# Altium schematic symbol library jlcpcb_2025_04_capacitors_extended_0402.schlib: 3594 symbols (part 6 of 20) (continued)
## C1005NP0470JGT
designator C?  Capacitance: 47pF  (hidden comment: *)
Capacitor, Ceramic (MLCC), 47pF, ±5%, 50V, NP0, ±5%, SMD 0402; Manufacturer: Darfon Elec; Manufacturer Part Number: C1005NP0470JGT; Package Size: 0402; JLCPCB Basic Part: No; JLCPCB Part Number: C258505; Supplier 1: LCSC; Category: Capacitors - MLCC; Supplier Part Number 1: C258505; Tolerance: ±5%; Voltage Rating: 50V; Temperature Coefficient: NP0; RoHS: Yes; ComponentLink1Description: Datasheet; ComponentLink1URL: https://wmsc.lcsc.com/wmsc/upload/file/pdf/v2/lcsc/2304140030_Darfon-Elec-C1005NP0470JGT_C258505.pdf; ComponentLink2Description: JLCPCB Part URL; ComponentLink2URL: https://jlcpcb.com/partdetail/C258505; ComponentLink3Description: LCSC Part URL; ComponentLink3URL: https://lcsc.com/product-detail/Multilayer-Ceramic-Capacitors-MLCC---SMD-SMT_Darfon-Elec-Darfon-Elec-C1005NP0470JGT_C258505.html
footprint CAP-0402 (0402 (1005M) Capacitor)
pins: 1, 2

## C1005NP0470KGTS
designator C?  Capacitance: 47pF  (hidden comment: *)
Capacitor, Ceramic (MLCC), 47pF, ±10%, 50V, NP0, ±10%, SMD 0402; Manufacturer: Darfon Elec; Manufacturer Part Number: C1005NP0470KGTS; Package Size: 0402; JLCPCB Basic Part: No; JLCPCB Part Number: C267398; Supplier 1: LCSC; Category: Capacitors - MLCC; Supplier Part Number 1: C267398; Tolerance: ±10%; Voltage Rating: 50V; Temperature Coefficient: NP0; RoHS: Yes; ComponentLink1Description: Datasheet; ComponentLink1URL: https://wmsc.lcsc.com/wmsc/upload/file/pdf/v2/lcsc/2304140030_Darfon-Elec-C1005NP0470KGTS_C267398.pdf; ComponentLink2Description: JLCPCB Part URL; ComponentLink2URL: https://jlcpcb.com/partdetail/C267398; ComponentLink3Description: LCSC Part URL; ComponentLink3URL: https://lcsc.com/product-detail/Multilayer-Ceramic-Capacitors-MLCC---SMD-SMT_Darfon-Elec-Darfon-Elec-C1005NP0470KGTS_C267398.html
footprint CAP-0402 (0402 (1005M) Capacitor)
pins: 1, 2

## C1005NP0471JGTS
designator C?  Capacitance: 470pF  (hidden comment: *)
Capacitor, Ceramic (MLCC), 470pF, ±5%, 50V, NP0, ±5%, SMD 0402; Manufacturer: Darfon Elec; Manufacturer Part Number: C1005NP0471JGTS; Package Size: 0402; JLCPCB Basic Part: No; JLCPCB Part Number: C147490; Supplier 1: LCSC; Category: Capacitors - MLCC; Supplier Part Number 1: C147490; Tolerance: ±5%; Voltage Rating: 50V; Temperature Coefficient: NP0; RoHS: Yes; ComponentLink1Description: Datasheet; ComponentLink1URL: https://wmsc.lcsc.com/wmsc/upload/file/pdf/v2/lcsc/2304140030_Darfon-Elec-C1005NP0471JGTS_C147490.pdf; ComponentLink2Description: JLCPCB Part URL; ComponentLink2URL: https://jlcpcb.com/partdetail/C147490; ComponentLink3Description: LCSC Part URL; ComponentLink3URL: https://lcsc.com/product-detail/Multilayer-Ceramic-Capacitors-MLCC---SMD-SMT_Darfon-Elec-Darfon-Elec-C1005NP0471JGTS_C147490.html
footprint CAP-0402 (0402 (1005M) Capacitor)
pins: 1, 2

## C1005NP0479CGT
designator C?  Capacitance: 4.7pF  (hidden comment: *)
Capacitor, Ceramic (MLCC), 4.7pF, 50V, NP0, SMD 0402; Manufacturer: Darfon Elec; Manufacturer Part Number: C1005NP0479CGT; Package Size: 0402; JLCPCB Basic Part: No; JLCPCB Part Number: C258495; Supplier 1: LCSC; Category: Capacitors - MLCC; Supplier Part Number 1: C258495; Voltage Rating: 50V; Temperature Coefficient: NP0; RoHS: Yes; ComponentLink1Description: Datasheet; ComponentLink1URL: https://wmsc.lcsc.com/wmsc/upload/file/pdf/v2/lcsc/2304140030_Darfon-Elec-C1005NP0479CGT_C258495.pdf; ComponentLink2Description: JLCPCB Part URL; ComponentLink2URL: https://jlcpcb.com/partdetail/C258495; ComponentLink3Description: LCSC Part URL; ComponentLink3URL: https://lcsc.com/product-detail/Multilayer-Ceramic-Capacitors-MLCC---SMD-SMT_Darfon-Elec-Darfon-Elec-C1005NP0479CGT_C258495.html
footprint CAP-0402 (0402 (1005M) Capacitor)
pins: 1, 2

## C1005NP0479CGTS
designator C?  Capacitance: 4.7pF  (hidden comment: *)
Capacitor, Ceramic (MLCC), 4.7pF, 50V, NP0, SMD 0402; Manufacturer: Darfon Elec; Manufacturer Part Number: C1005NP0479CGTS; Package Size: 0402; JLCPCB Basic Part: No; JLCPCB Part Number: C147369; Supplier 1: LCSC; Category: Capacitors - MLCC; Supplier Part Number 1: C147369; Voltage Rating: 50V; Temperature Coefficient: NP0; RoHS: Yes; ComponentLink1Description: Datasheet; ComponentLink1URL: https://wmsc.lcsc.com/wmsc/upload/file/pdf/v2/lcsc/2304140030_Darfon-Elec-C1005NP0479CGTS_C147369.pdf; ComponentLink2Description: JLCPCB Part URL; ComponentLink2URL: https://jlcpcb.com/partdetail/C147369; ComponentLink3Description: LCSC Part URL; ComponentLink3URL: https://lcsc.com/product-detail/Multilayer-Ceramic-Capacitors-MLCC---SMD-SMT_Darfon-Elec-Darfon-Elec-C1005NP0479CGTS_C147369.html
footprint CAP-0402 (0402 (1005M) Capacitor)
pins: 1, 2

## C1005NP0508BGTS
designator C?  Capacitance: 0.5pF  (hidden comment: *)
Capacitor, Ceramic (MLCC), 0.5pF, 50V, NP0, SMD 0402; Manufacturer: Darfon Elec; Manufacturer Part Number: C1005NP0508BGTS; Package Size: 0402; JLCPCB Basic Part: No; JLCPCB Part Number: C2987830; Supplier 1: LCSC; Category: Capacitors - MLCC; Supplier Part Number 1: C2987830; Voltage Rating: 50V; Temperature Coefficient: NP0; RoHS: Yes; ComponentLink1Description: Datasheet; ComponentLink1URL: https://wmsc.lcsc.com/wmsc/upload/file/pdf/v2/lcsc/2204011630_Darfon-Elec-C1005NP0508BGTS_C2987830.pdf; ComponentLink2Description: JLCPCB Part URL; ComponentLink2URL: https://jlcpcb.com/partdetail/C2987830; ComponentLink3Description: LCSC Part URL; ComponentLink3URL: https://lcsc.com/product-detail/Multilayer-Ceramic-Capacitors-MLCC---SMD-SMT_Darfon-Elec-Darfon-Elec-C1005NP0508BGTS_C2987830.html
footprint CAP-0402 (0402 (1005M) Capacitor)
pins: 1, 2

## C1005NP0508CGT
designator C?  Capacitance: 0.5pF  (hidden comment: *)
Capacitor, Ceramic (MLCC), 0.5pF, 50V, NP0, SMD 0402; Manufacturer: Darfon Elec; Manufacturer Part Number: C1005NP0508CGT; Package Size: 0402; JLCPCB Basic Part: No; JLCPCB Part Number: C258483; Supplier 1: LCSC; Category: Capacitors - MLCC; Supplier Part Number 1: C258483; Voltage Rating: 50V; Temperature Coefficient: NP0; RoHS: Yes; ComponentLink1Description: Datasheet; ComponentLink1URL: https://wmsc.lcsc.com/wmsc/upload/file/pdf/v2/lcsc/2304140030_Darfon-Elec-C1005NP0508CGT_C258483.pdf; ComponentLink2Description: JLCPCB Part URL; ComponentLink2URL: https://jlcpcb.com/partdetail/C258483; ComponentLink3Description: LCSC Part URL; ComponentLink3URL: https://lcsc.com/product-detail/Multilayer-Ceramic-Capacitors-MLCC---SMD-SMT_Darfon-Elec-Darfon-Elec-C1005NP0508CGT_C258483.html
footprint CAP-0402 (0402 (1005M) Capacitor)
pins: 1, 2

## C1005NP0508CGTS
designator C?  Capacitance: 0.5pF  (hidden comment: *)
Capacitor, Ceramic (MLCC), 0.5pF, 50V, NP0, SMD 0402; Manufacturer: Darfon Elec; Manufacturer Part Number: C1005NP0508CGTS; Package Size: 0402; JLCPCB Basic Part: No; JLCPCB Part Number: C147327; Supplier 1: LCSC; Category: Capacitors - MLCC; Supplier Part Number 1: C147327; Voltage Rating: 50V; Temperature Coefficient: NP0; RoHS: Yes; ComponentLink1Description: Datasheet; ComponentLink1URL: https://wmsc.lcsc.com/wmsc/upload/file/pdf/v2/lcsc/2304140030_Darfon-Elec-C1005NP0508CGTS_C147327.pdf; ComponentLink2Description: JLCPCB Part URL; ComponentLink2URL: https://jlcpcb.com/partdetail/C147327; ComponentLink3Description: LCSC Part URL; ComponentLink3URL: https://lcsc.com/product-detail/Multilayer-Ceramic-Capacitors-MLCC---SMD-SMT_Darfon-Elec-Darfon-Elec-C1005NP0508CGTS_C147327.html
footprint CAP-0402 (0402 (1005M) Capacitor)
pins: 1, 2

## C1005NP0508DGTS
designator C?  Capacitance: 0.5pF  (hidden comment: *)
Capacitor, Ceramic (MLCC), 0.5pF, 50V, NP0, SMD 0402; Manufacturer: Darfon Elec; Manufacturer Part Number: C1005NP0508DGTS; Package Size: 0402; JLCPCB Basic Part: No; JLCPCB Part Number: C311880; Supplier 1: LCSC; Category: Capacitors - MLCC; Supplier Part Number 1: C311880; Voltage Rating: 50V; Temperature Coefficient: NP0; RoHS: Yes; ComponentLink1Description: Datasheet; ComponentLink1URL: https://wmsc.lcsc.com/wmsc/upload/file/pdf/v2/lcsc/2304140030_Darfon-Elec-C1005NP0508DGTS_C311880.pdf; ComponentLink2Description: JLCPCB Part URL; ComponentLink2URL: https://jlcpcb.com/partdetail/C311880; ComponentLink3Description: LCSC Part URL; ComponentLink3URL: https://lcsc.com/product-detail/Multilayer-Ceramic-Capacitors-MLCC---SMD-SMT_Darfon-Elec-Darfon-Elec-C1005NP0508DGTS_C311880.html
footprint CAP-0402 (0402 (1005M) Capacitor)
pins: 1, 2

## C1005NP0509CGTS
designator C?  Capacitance: 5pF  (hidden comment: *)
Capacitor, Ceramic (MLCC), 5pF, 50V, NP0, SMD 0402; Manufacturer: Darfon Elec; Manufacturer Part Number: C1005NP0509CGTS; Package Size: 0402; JLCPCB Basic Part: No; JLCPCB Part Number: C359289; Supplier 1: LCSC; Category: Capacitors - MLCC; Supplier Part Number 1: C359289; Voltage Rating: 50V; Temperature Coefficient: NP0; RoHS: Yes; ComponentLink1Description: Datasheet; ComponentLink1URL: https://wmsc.lcsc.com/wmsc/upload/file/pdf/v2/lcsc/2304140030_Darfon-Elec-C1005NP0509CGTS_C359289.pdf; ComponentLink2Description: JLCPCB Part URL; ComponentLink2URL: https://jlcpcb.com/partdetail/C359289; ComponentLink3Description: LCSC Part URL; ComponentLink3URL: https://lcsc.com/product-detail/Multilayer-Ceramic-Capacitors-MLCC---SMD-SMT_Darfon-Elec-Darfon-Elec-C1005NP0509CGTS_C359289.html
footprint CAP-0402 (0402 (1005M) Capacitor)
pins: 1, 2

## C1005NP0509DGTS
designator C?  Capacitance: 5pF  (hidden comment: *)
Capacitor, Ceramic (MLCC), 5pF, 50V, NP0, SMD 0402; Manufacturer: Darfon Elec; Manufacturer Part Number: C1005NP0509DGTS; Package Size: 0402; JLCPCB Basic Part: No; JLCPCB Part Number: C147372; Supplier 1: LCSC; Category: Capacitors - MLCC; Supplier Part Number 1: C147372; Voltage Rating: 50V; Temperature Coefficient: NP0; RoHS: Yes; ComponentLink1Description: Datasheet; ComponentLink1URL: https://wmsc.lcsc.com/wmsc/upload/file/pdf/v2/lcsc/2304140030_Darfon-Elec-C1005NP0509DGTS_C147372.pdf; ComponentLink2Description: JLCPCB Part URL; ComponentLink2URL: https://jlcpcb.com/partdetail/C147372; ComponentLink3Description: LCSC Part URL; ComponentLink3URL: https://lcsc.com/product-detail/Multilayer-Ceramic-Capacitors-MLCC---SMD-SMT_Darfon-Elec-Darfon-Elec-C1005NP0509DGTS_C147372.html
footprint CAP-0402 (0402 (1005M) Capacitor)
pins: 1, 2

## C1005NP0560JGT
designator C?  Capacitance: 56pF  (hidden comment: *)
Capacitor, Ceramic (MLCC), 56pF, ±5%, 50V, NP0, ±5%, SMD 0402; Manufacturer: Darfon Elec; Manufacturer Part Number: C1005NP0560JGT; Package Size: 0402; JLCPCB Basic Part: No; JLCPCB Part Number: C258506; Supplier 1: LCSC; Category: Capacitors - MLCC; Supplier Part Number 1: C258506; Tolerance: ±5%; Voltage Rating: 50V; Temperature Coefficient: NP0; RoHS: Yes; ComponentLink1Description: Datasheet; ComponentLink1URL: https://wmsc.lcsc.com/wmsc/upload/file/pdf/v2/lcsc/2304140030_Darfon-Elec-C1005NP0560JGT_C258506.pdf; ComponentLink2Description: JLCPCB Part URL; ComponentLink2URL: https://jlcpcb.com/partdetail/C258506; ComponentLink3Description: LCSC Part URL; ComponentLink3URL: https://lcsc.com/product-detail/Multilayer-Ceramic-Capacitors-MLCC---SMD-SMT_Darfon-Elec-Darfon-Elec-C1005NP0560JGT_C258506.html
footprint CAP-0402 (0402 (1005M) Capacitor)
pins: 1, 2

## C1005NP0560JGTS
designator C?  Capacitance: 56pF  (hidden comment: *)
Capacitor, Ceramic (MLCC), 56pF, ±5%, 50V, NP0, ±5%, SMD 0402; Manufacturer: Darfon Elec; Manufacturer Part Number: C1005NP0560JGTS; Package Size: 0402; JLCPCB Basic Part: No; JLCPCB Part Number: C147458; Supplier 1: LCSC; Category: Capacitors - MLCC; Supplier Part Number 1: C147458; Tolerance: ±5%; Voltage Rating: 50V; Temperature Coefficient: NP0; RoHS: Yes; ComponentLink1Description: Datasheet; ComponentLink1URL: https://wmsc.lcsc.com/wmsc/upload/file/pdf/v2/lcsc/2304140030_Darfon-Elec-C1005NP0560JGTS_C147458.pdf; ComponentLink2Description: JLCPCB Part URL; ComponentLink2URL: https://jlcpcb.com/partdetail/C147458; ComponentLink3Description: LCSC Part URL; ComponentLink3URL: https://lcsc.com/product-detail/Multilayer-Ceramic-Capacitors-MLCC---SMD-SMT_Darfon-Elec-Darfon-Elec-C1005NP0560JGTS_C147458.html
footprint CAP-0402 (0402 (1005M) Capacitor)
pins: 1, 2

## C1005NP0560KGTS
designator C?  Capacitance: 56pF  (hidden comment: *)
Capacitor, Ceramic (MLCC), 56pF, ±10%, 50V, NP0, ±10%, SMD 0402; Manufacturer: Darfon Elec; Manufacturer Part Number: C1005NP0560KGTS; Package Size: 0402; JLCPCB Basic Part: No; JLCPCB Part Number: C311876; Supplier 1: LCSC; Category: Capacitors - MLCC; Supplier Part Number 1: C311876; Tolerance: ±10%; Voltage Rating: 50V; Temperature Coefficient: NP0; RoHS: Yes; ComponentLink1Description: Datasheet; ComponentLink1URL: https://wmsc.lcsc.com/wmsc/upload/file/pdf/v2/lcsc/2304140030_Darfon-Elec-C1005NP0560KGTS_C311876.pdf; ComponentLink2Description: JLCPCB Part URL; ComponentLink2URL: https://jlcpcb.com/partdetail/C311876; ComponentLink3Description: LCSC Part URL; ComponentLink3URL: https://lcsc.com/product-detail/Multilayer-Ceramic-Capacitors-MLCC---SMD-SMT_Darfon-Elec-Darfon-Elec-C1005NP0560KGTS_C311876.html
footprint CAP-0402 (0402 (1005M) Capacitor)
pins: 1, 2

## C1005NP0569DGT
designator C?  Capacitance: 5.6pF  (hidden comment: *)
Capacitor, Ceramic (MLCC), 5.6pF, 50V, NP0, SMD 0402; Manufacturer: Darfon Elec; Manufacturer Part Number: C1005NP0569DGT; Package Size: 0402; JLCPCB Basic Part: No; JLCPCB Part Number: C258497; Supplier 1: LCSC; Category: Capacitors - MLCC; Supplier Part Number 1: C258497; Voltage Rating: 50V; Temperature Coefficient: NP0; RoHS: Yes; ComponentLink1Description: Datasheet; ComponentLink1URL: https://wmsc.lcsc.com/wmsc/upload/file/pdf/v2/lcsc/2304140030_Darfon-Elec-C1005NP0569DGT_C258497.pdf; ComponentLink2Description: JLCPCB Part URL; ComponentLink2URL: https://jlcpcb.com/partdetail/C258497; ComponentLink3Description: LCSC Part URL; ComponentLink3URL: https://lcsc.com/product-detail/Multilayer-Ceramic-Capacitors-MLCC---SMD-SMT_Darfon-Elec-Darfon-Elec-C1005NP0569DGT_C258497.html
footprint CAP-0402 (0402 (1005M) Capacitor)
pins: 1, 2

## C1005NP0569DGTS
designator C?  Capacitance: 5.6pF  (hidden comment: *)
Capacitor, Ceramic (MLCC), 5.6pF, 50V, NP0, SMD 0402; Manufacturer: Darfon Elec; Manufacturer Part Number: C1005NP0569DGTS; Package Size: 0402; JLCPCB Basic Part: No; JLCPCB Part Number: C147378; Supplier 1: LCSC; Category: Capacitors - MLCC; Supplier Part Number 1: C147378; Voltage Rating: 50V; Temperature Coefficient: NP0; RoHS: Yes; ComponentLink1Description: Datasheet; ComponentLink1URL: https://wmsc.lcsc.com/wmsc/upload/file/pdf/v2/lcsc/2304140030_Darfon-Elec-C1005NP0569DGTS_C147378.pdf; ComponentLink2Description: JLCPCB Part URL; ComponentLink2URL: https://jlcpcb.com/partdetail/C147378; ComponentLink3Description: LCSC Part URL; ComponentLink3URL: https://lcsc.com/product-detail/Multilayer-Ceramic-Capacitors-MLCC---SMD-SMT_Darfon-Elec-Darfon-Elec-C1005NP0569DGTS_C147378.html
footprint CAP-0402 (0402 (1005M) Capacitor)
pins: 1, 2

## C1005NP0608AGTQ
designator C?  Capacitance: 0.6pF  (hidden comment: *)
Capacitor, Ceramic (MLCC), 0.6pF, 50V, NP0, SMD 0402; Manufacturer: Darfon Elec; Manufacturer Part Number: C1005NP0608AGTQ; Package Size: 0402; JLCPCB Basic Part: No; JLCPCB Part Number: C718625; Supplier 1: LCSC; Category: Capacitors - MLCC; Supplier Part Number 1: C718625; Voltage Rating: 50V; Temperature Coefficient: NP0; RoHS: Yes; ComponentLink1Description: Datasheet; ComponentLink1URL: https://wmsc.lcsc.com/wmsc/upload/file/pdf/v2/lcsc/2304140030_Darfon-Elec-C1005NP0608AGTQ_C718625.pdf; ComponentLink2Description: JLCPCB Part URL; ComponentLink2URL: https://jlcpcb.com/partdetail/C718625; ComponentLink3Description: LCSC Part URL; ComponentLink3URL: https://lcsc.com/product-detail/Multilayer-Ceramic-Capacitors-MLCC---SMD-SMT_Darfon-Elec-Darfon-Elec-C1005NP0608AGTQ_C718625.html
footprint CAP-0402 (0402 (1005M) Capacitor)
pins: 1, 2

## C1005NP0609DGT
designator C?  Capacitance: 6pF  (hidden comment: *)
Capacitor, Ceramic (MLCC), 6pF, 50V, NP0, SMD 0402; Manufacturer: Darfon Elec; Manufacturer Part Number: C1005NP0609DGT; Package Size: 0402; JLCPCB Basic Part: No; JLCPCB Part Number: C258498; Supplier 1: LCSC; Category: Capacitors - MLCC; Supplier Part Number 1: C258498; Voltage Rating: 50V; Temperature Coefficient: NP0; RoHS: Yes; ComponentLink1Description: Datasheet; ComponentLink1URL: https://wmsc.lcsc.com/wmsc/upload/file/pdf/v2/lcsc/2304140030_Darfon-Elec-C1005NP0609DGT_C258498.pdf; ComponentLink2Description: JLCPCB Part URL; ComponentLink2URL: https://jlcpcb.com/partdetail/C258498; ComponentLink3Description: LCSC Part URL; ComponentLink3URL: https://lcsc.com/product-detail/Multilayer-Ceramic-Capacitors-MLCC---SMD-SMT_Darfon-Elec-Darfon-Elec-C1005NP0609DGT_C258498.html
footprint CAP-0402 (0402 (1005M) Capacitor)
pins: 1, 2

## C1005NP0609DGTS
designator C?  Capacitance: 6pF  (hidden comment: *)
Capacitor, Ceramic (MLCC), 6pF, 50V, NP0, SMD 0402; Manufacturer: Darfon Elec; Manufacturer Part Number: C1005NP0609DGTS; Package Size: 0402; JLCPCB Basic Part: No; JLCPCB Part Number: C147381; Supplier 1: LCSC; Category: Capacitors - MLCC; Supplier Part Number 1: C147381; Voltage Rating: 50V; Temperature Coefficient: NP0; RoHS: Yes; ComponentLink1Description: Datasheet; ComponentLink1URL: https://wmsc.lcsc.com/wmsc/upload/file/pdf/v2/lcsc/2304140030_Darfon-Elec-C1005NP0609DGTS_C147381.pdf; ComponentLink2Description: JLCPCB Part URL; ComponentLink2URL: https://jlcpcb.com/partdetail/C147381; ComponentLink3Description: LCSC Part URL; ComponentLink3URL: https://lcsc.com/product-detail/Multilayer-Ceramic-Capacitors-MLCC---SMD-SMT_Darfon-Elec-Darfon-Elec-C1005NP0609DGTS_C147381.html
footprint CAP-0402 (0402 (1005M) Capacitor)
pins: 1, 2

## C1005NP0680JGTS
designator C?  Capacitance: 68pF  (hidden comment: *)
Capacitor, Ceramic (MLCC), 68pF, ±5%, 50V, NP0, ±5%, SMD 0402; Manufacturer: Darfon Elec; Manufacturer Part Number: C1005NP0680JGTS; Package Size: 0402; JLCPCB Basic Part: No; JLCPCB Part Number: C147464; Supplier 1: LCSC; Category: Capacitors - MLCC; Supplier Part Number 1: C147464; Tolerance: ±5%; Voltage Rating: 50V; Temperature Coefficient: NP0; RoHS: Yes; ComponentLink1Description: Datasheet; ComponentLink1URL: https://wmsc.lcsc.com/wmsc/upload/file/pdf/v2/lcsc/2304140030_Darfon-Elec-C1005NP0680JGTS_C147464.pdf; ComponentLink2Description: JLCPCB Part URL; ComponentLink2URL: https://jlcpcb.com/partdetail/C147464; ComponentLink3Description: LCSC Part URL; ComponentLink3URL: https://lcsc.com/product-detail/Multilayer-Ceramic-Capacitors-MLCC---SMD-SMT_Darfon-Elec-Darfon-Elec-C1005NP0680JGTS_C147464.html
footprint CAP-0402 (0402 (1005M) Capacitor)
pins: 1, 2

## C1005NP0680KGTS
designator C?  Capacitance: 68pF  (hidden comment: *)
Capacitor, Ceramic (MLCC), 68pF, ±10%, 50V, NP0, ±10%, SMD 0402; Manufacturer: Darfon Elec; Manufacturer Part Number: C1005NP0680KGTS; Package Size: 0402; JLCPCB Basic Part: No; JLCPCB Part Number: C311866; Supplier 1: LCSC; Category: Capacitors - MLCC; Supplier Part Number 1: C311866; Tolerance: ±10%; Voltage Rating: 50V; Temperature Coefficient: NP0; RoHS: Yes; ComponentLink1Description: Datasheet; ComponentLink1URL: https://wmsc.lcsc.com/wmsc/upload/file/pdf/v2/lcsc/2304140030_Darfon-Elec-C1005NP0680KGTS_C311866.pdf; ComponentLink2Description: JLCPCB Part URL; ComponentLink2URL: https://jlcpcb.com/partdetail/C311866; ComponentLink3Description: LCSC Part URL; ComponentLink3URL: https://lcsc.com/product-detail/Multilayer-Ceramic-Capacitors-MLCC---SMD-SMT_Darfon-Elec-Darfon-Elec-C1005NP0680KGTS_C311866.html
footprint CAP-0402 (0402 (1005M) Capacitor)
pins: 1, 2

## C1005NP0689DGT
designator C?  Capacitance: 6.8pF  (hidden comment: *)
Capacitor, Ceramic (MLCC), 6.8pF, 50V, NP0, SMD 0402; Manufacturer: Darfon Elec; Manufacturer Part Number: C1005NP0689DGT; Package Size: 0402; JLCPCB Basic Part: No; JLCPCB Part Number: C258499; Supplier 1: LCSC; Category: Capacitors - MLCC; Supplier Part Number 1: C258499; Voltage Rating: 50V; Temperature Coefficient: NP0; RoHS: Yes; ComponentLink1Description: Datasheet; ComponentLink1URL: https://wmsc.lcsc.com/wmsc/upload/file/pdf/v2/lcsc/2304140030_Darfon-Elec-C1005NP0689DGT_C258499.pdf; ComponentLink2Description: JLCPCB Part URL; ComponentLink2URL: https://jlcpcb.com/partdetail/C258499; ComponentLink3Description: LCSC Part URL; ComponentLink3URL: https://lcsc.com/product-detail/Multilayer-Ceramic-Capacitors-MLCC---SMD-SMT_Darfon-Elec-Darfon-Elec-C1005NP0689DGT_C258499.html
footprint CAP-0402 (0402 (1005M) Capacitor)
pins: 1, 2

## C1005NP0689DGTS
designator C?  Capacitance: 6.8pF  (hidden comment: *)
Capacitor, Ceramic (MLCC), 6.8pF, 50V, NP0, SMD 0402; Manufacturer: Darfon Elec; Manufacturer Part Number: C1005NP0689DGTS; Package Size: 0402; JLCPCB Basic Part: No; JLCPCB Part Number: C147387; Supplier 1: LCSC; Category: Capacitors - MLCC; Supplier Part Number 1: C147387; Voltage Rating: 50V; Temperature Coefficient: NP0; RoHS: Yes; ComponentLink1Description: Datasheet; ComponentLink1URL: https://wmsc.lcsc.com/wmsc/upload/file/pdf/v2/lcsc/2304140030_Darfon-Elec-C1005NP0689DGTS_C147387.pdf; ComponentLink2Description: JLCPCB Part URL; ComponentLink2URL: https://jlcpcb.com/partdetail/C147387; ComponentLink3Description: LCSC Part URL; ComponentLink3URL: https://lcsc.com/product-detail/Multilayer-Ceramic-Capacitors-MLCC---SMD-SMT_Darfon-Elec-Darfon-Elec-C1005NP0689DGTS_C147387.html
footprint CAP-0402 (0402 (1005M) Capacitor)
pins: 1, 2

## C1005NP0709DGTS
designator C?  Capacitance: 7pF  (hidden comment: *)
Capacitor, Ceramic (MLCC), 7pF, 50V, NP0, SMD 0402; Manufacturer: Darfon Elec; Manufacturer Part Number: C1005NP0709DGTS; Package Size: 0402; JLCPCB Basic Part: No; JLCPCB Part Number: C147390; Supplier 1: LCSC; Category: Capacitors - MLCC; Supplier Part Number 1: C147390; Voltage Rating: 50V; Temperature Coefficient: NP0; RoHS: Yes; ComponentLink1Description: Datasheet; ComponentLink1URL: https://wmsc.lcsc.com/wmsc/upload/file/pdf/v2/lcsc/2304140030_Darfon-Elec-C1005NP0709DGTS_C147390.pdf; ComponentLink2Description: JLCPCB Part URL; ComponentLink2URL: https://jlcpcb.com/partdetail/C147390; ComponentLink3Description: LCSC Part URL; ComponentLink3URL: https://lcsc.com/product-detail/Multilayer-Ceramic-Capacitors-MLCC---SMD-SMT_Darfon-Elec-Darfon-Elec-C1005NP0709DGTS_C147390.html
footprint CAP-0402 (0402 (1005M) Capacitor)
pins: 1, 2

## C1005NP0758CGTS
designator C?  Capacitance: 0.75pF  (hidden comment: *)
Capacitor, Ceramic (MLCC), 0.75pF, 50V, NP0, SMD 0402; Manufacturer: Darfon Elec; Manufacturer Part Number: C1005NP0758CGTS; Package Size: 0402; JLCPCB Basic Part: No; JLCPCB Part Number: C311856; Supplier 1: LCSC; Category: Capacitors - MLCC; Supplier Part Number 1: C311856; Voltage Rating: 50V; Temperature Coefficient: NP0; RoHS: Yes; ComponentLink1Description: Datasheet; ComponentLink1URL: https://wmsc.lcsc.com/wmsc/upload/file/pdf/v2/lcsc/2304140030_Darfon-Elec-C1005NP0758CGTS_C311856.pdf; ComponentLink2Description: JLCPCB Part URL; ComponentLink2URL: https://jlcpcb.com/partdetail/C311856; ComponentLink3Description: LCSC Part URL; ComponentLink3URL: https://lcsc.com/product-detail/Multilayer-Ceramic-Capacitors-MLCC---SMD-SMT_Darfon-Elec-Darfon-Elec-C1005NP0758CGTS_C311856.html
footprint CAP-0402 (0402 (1005M) Capacitor)
pins: 1, 2

## C1005NP0808CGT
designator C?  Capacitance: 0.8pF  (hidden comment: *)
Capacitor, Ceramic (MLCC), 0.8pF, 50V, NP0, SMD 0402; Manufacturer: Darfon Elec; Manufacturer Part Number: C1005NP0808CGT; Package Size: 0402; JLCPCB Basic Part: No; JLCPCB Part Number: C258484; Supplier 1: LCSC; Category: Capacitors - MLCC; Supplier Part Number 1: C258484; Voltage Rating: 50V; Temperature Coefficient: NP0; RoHS: Yes; ComponentLink1Description: Datasheet; ComponentLink1URL: https://wmsc.lcsc.com/wmsc/upload/file/pdf/v2/lcsc/2304140030_Darfon-Elec-C1005NP0808CGT_C258484.pdf; ComponentLink2Description: JLCPCB Part URL; ComponentLink2URL: https://jlcpcb.com/partdetail/C258484; ComponentLink3Description: LCSC Part URL; ComponentLink3URL: https://lcsc.com/product-detail/Multilayer-Ceramic-Capacitors-MLCC---SMD-SMT_Darfon-Elec-Darfon-Elec-C1005NP0808CGT_C258484.html
footprint CAP-0402 (0402 (1005M) Capacitor)
pins: 1, 2

## C1005NP0809DGT
designator C?  Capacitance: 8pF  (hidden comment: *)
Capacitor, Ceramic (MLCC), 8pF, 50V, NP0, SMD 0402; Manufacturer: Darfon Elec; Manufacturer Part Number: C1005NP0809DGT; Package Size: 0402; JLCPCB Basic Part: No; JLCPCB Part Number: C258500; Supplier 1: LCSC; Category: Capacitors - MLCC; Supplier Part Number 1: C258500; Voltage Rating: 50V; Temperature Coefficient: NP0; RoHS: Yes; ComponentLink1Description: Datasheet; ComponentLink1URL: https://wmsc.lcsc.com/wmsc/upload/file/pdf/v2/lcsc/2304140030_Darfon-Elec-C1005NP0809DGT_C258500.pdf; ComponentLink2Description: JLCPCB Part URL; ComponentLink2URL: https://jlcpcb.com/partdetail/C258500; ComponentLink3Description: LCSC Part URL; ComponentLink3URL: https://lcsc.com/product-detail/Multilayer-Ceramic-Capacitors-MLCC---SMD-SMT_Darfon-Elec-Darfon-Elec-C1005NP0809DGT_C258500.html
footprint CAP-0402 (0402 (1005M) Capacitor)
pins: 1, 2

## C1005NP0809DGTS
designator C?  Capacitance: 8pF  (hidden comment: *)
Capacitor, Ceramic (MLCC), 8pF, 50V, NP0, SMD 0402; Manufacturer: Darfon Elec; Manufacturer Part Number: C1005NP0809DGTS; Package Size: 0402; JLCPCB Basic Part: No; JLCPCB Part Number: C147396; Supplier 1: LCSC; Category: Capacitors - MLCC; Supplier Part Number 1: C147396; Voltage Rating: 50V; Temperature Coefficient: NP0; RoHS: Yes; ComponentLink1Description: Datasheet; ComponentLink1URL: https://wmsc.lcsc.com/wmsc/upload/file/pdf/v2/lcsc/2304140030_Darfon-Elec-C1005NP0809DGTS_C147396.pdf; ComponentLink2Description: JLCPCB Part URL; ComponentLink2URL: https://jlcpcb.com/partdetail/C147396; ComponentLink3Description: LCSC Part URL; ComponentLink3URL: https://lcsc.com/product-detail/Multilayer-Ceramic-Capacitors-MLCC---SMD-SMT_Darfon-Elec-Darfon-Elec-C1005NP0809DGTS_C147396.html
footprint CAP-0402 (0402 (1005M) Capacitor)
pins: 1, 2

## C1005NP0820JGTS
designator C?  Capacitance: 82pF  (hidden comment: *)
Capacitor, Ceramic (MLCC), 82pF, ±5%, 50V, NP0, ±5%, SMD 0402; Manufacturer: Darfon Elec; Manufacturer Part Number: C1005NP0820JGTS; Package Size: 0402; JLCPCB Basic Part: No; JLCPCB Part Number: C147470; Supplier 1: LCSC; Category: Capacitors - MLCC; Supplier Part Number 1: C147470; Tolerance: ±5%; Voltage Rating: 50V; Temperature Coefficient: NP0; RoHS: Yes; ComponentLink1Description: Datasheet; ComponentLink1URL: https://wmsc.lcsc.com/wmsc/upload/file/pdf/v2/lcsc/2304140030_Darfon-Elec-C1005NP0820JGTS_C147470.pdf; ComponentLink2Description: JLCPCB Part URL; ComponentLink2URL: https://jlcpcb.com/partdetail/C147470; ComponentLink3Description: LCSC Part URL; ComponentLink3URL: https://lcsc.com/product-detail/Multilayer-Ceramic-Capacitors-MLCC---SMD-SMT_Darfon-Elec-Darfon-Elec-C1005NP0820JGTS_C147470.html
footprint CAP-0402 (0402 (1005M) Capacitor)
pins: 1, 2

## C1005NP0820KGTS
designator C?  Capacitance: 82pF  (hidden comment: *)
Capacitor, Ceramic (MLCC), 82pF, ±10%, 50V, NP0, ±10%, SMD 0402; Manufacturer: Darfon Elec; Manufacturer Part Number: C1005NP0820KGTS; Package Size: 0402; JLCPCB Basic Part: No; JLCPCB Part Number: C311842; Supplier 1: LCSC; Category: Capacitors - MLCC; Supplier Part Number 1: C311842; Tolerance: ±10%; Voltage Rating: 50V; Temperature Coefficient: NP0; RoHS: Yes; ComponentLink1Description: Datasheet; ComponentLink1URL: https://wmsc.lcsc.com/wmsc/upload/file/pdf/v2/lcsc/2304140030_Darfon-Elec-C1005NP0820KGTS_C311842.pdf; ComponentLink2Description: JLCPCB Part URL; ComponentLink2URL: https://jlcpcb.com/partdetail/C311842; ComponentLink3Description: LCSC Part URL; ComponentLink3URL: https://lcsc.com/product-detail/Multilayer-Ceramic-Capacitors-MLCC---SMD-SMT_Darfon-Elec-Darfon-Elec-C1005NP0820KGTS_C311842.html
footprint CAP-0402 (0402 (1005M) Capacitor)
pins: 1, 2

## C1005NP0829CGTS
designator C?  Capacitance: 8.2pF  (hidden comment: *)
Capacitor, Ceramic (MLCC), 8.2pF, 50V, NP0, SMD 0402; Manufacturer: Darfon Elec; Manufacturer Part Number: C1005NP0829CGTS; Package Size: 0402; JLCPCB Basic Part: No; JLCPCB Part Number: C725589; Supplier 1: LCSC; Category: Capacitors - MLCC; Supplier Part Number 1: C725589; Voltage Rating: 50V; Temperature Coefficient: NP0; RoHS: Yes; ComponentLink1Description: Datasheet; ComponentLink1URL: https://wmsc.lcsc.com/wmsc/upload/file/pdf/v2/lcsc/2304140030_Darfon-Elec-C1005NP0829CGTS_C725589.pdf; ComponentLink2Description: JLCPCB Part URL; ComponentLink2URL: https://jlcpcb.com/partdetail/C725589; ComponentLink3Description: LCSC Part URL; ComponentLink3URL: https://lcsc.com/product-detail/Multilayer-Ceramic-Capacitors-MLCC---SMD-SMT_Darfon-Elec-Darfon-Elec-C1005NP0829CGTS_C725589.html
footprint CAP-0402 (0402 (1005M) Capacitor)
pins: 1, 2

## C1005NP0829DGTS
designator C?  Capacitance: 8.2pF  (hidden comment: *)
Capacitor, Ceramic (MLCC), 8.2pF, 50V, NP0, SMD 0402; Manufacturer: Darfon Elec; Manufacturer Part Number: C1005NP0829DGTS; Package Size: 0402; JLCPCB Basic Part: No; JLCPCB Part Number: C147399; Supplier 1: LCSC; Category: Capacitors - MLCC; Supplier Part Number 1: C147399; Voltage Rating: 50V; Temperature Coefficient: NP0; RoHS: Yes; ComponentLink1Description: Datasheet; ComponentLink1URL: https://wmsc.lcsc.com/wmsc/upload/file/pdf/v2/lcsc/2304140030_Darfon-Elec-C1005NP0829DGTS_C147399.pdf; ComponentLink2Description: JLCPCB Part URL; ComponentLink2URL: https://jlcpcb.com/partdetail/C147399; ComponentLink3Description: LCSC Part URL; ComponentLink3URL: https://lcsc.com/product-detail/Multilayer-Ceramic-Capacitors-MLCC---SMD-SMT_Darfon-Elec-Darfon-Elec-C1005NP0829DGTS_C147399.html
footprint CAP-0402 (0402 (1005M) Capacitor)
pins: 1, 2

## C1005NP0909CGTS
designator C?  Capacitance: 9pF  (hidden comment: *)
Capacitor, Ceramic (MLCC), 9pF, 50V, NP0, SMD 0402; Manufacturer: Darfon Elec; Manufacturer Part Number: C1005NP0909CGTS; Package Size: 0402; JLCPCB Basic Part: No; JLCPCB Part Number: C147401; Supplier 1: LCSC; Category: Capacitors - MLCC; Supplier Part Number 1: C147401; Voltage Rating: 50V; Temperature Coefficient: NP0; RoHS: Yes; ComponentLink1Description: Datasheet; ComponentLink1URL: https://wmsc.lcsc.com/wmsc/upload/file/pdf/v2/lcsc/2304140030_Darfon-Elec-C1005NP0909CGTS_C147401.pdf; ComponentLink2Description: JLCPCB Part URL; ComponentLink2URL: https://jlcpcb.com/partdetail/C147401; ComponentLink3Description: LCSC Part URL; ComponentLink3URL: https://lcsc.com/product-detail/Multilayer-Ceramic-Capacitors-MLCC---SMD-SMT_Darfon-Elec-Darfon-Elec-C1005NP0909CGTS_C147401.html
footprint CAP-0402 (0402 (1005M) Capacitor)
pins: 1, 2

## C1005NP0909DGTS
designator C?  Capacitance: 9pF  (hidden comment: *)
Capacitor, Ceramic (MLCC), 9pF, 50V, NP0, SMD 0402; Manufacturer: Darfon Elec; Manufacturer Part Number: C1005NP0909DGTS; Package Size: 0402; JLCPCB Basic Part: No; JLCPCB Part Number: C147402; Supplier 1: LCSC; Category: Capacitors - MLCC; Supplier Part Number 1: C147402; Voltage Rating: 50V; Temperature Coefficient: NP0; RoHS: Yes; ComponentLink1Description: Datasheet; ComponentLink1URL: https://wmsc.lcsc.com/wmsc/upload/file/pdf/v2/lcsc/2304140030_Darfon-Elec-C1005NP0909DGTS_C147402.pdf; ComponentLink2Description: JLCPCB Part URL; ComponentLink2URL: https://jlcpcb.com/partdetail/C147402; ComponentLink3Description: LCSC Part URL; ComponentLink3URL: https://lcsc.com/product-detail/Multilayer-Ceramic-Capacitors-MLCC---SMD-SMT_Darfon-Elec-Darfon-Elec-C1005NP0909DGTS_C147402.html
footprint CAP-0402 (0402 (1005M) Capacitor)
pins: 1, 2

## C1005NPO100DGT
designator C?  Capacitance: 10pF  (hidden comment: *)
Capacitor, Ceramic (MLCC), 10pF, 50V, NP0, SMD 0402; Manufacturer: Darfon Elec; Manufacturer Part Number: C1005NPO100DGT; Package Size: 0402; JLCPCB Basic Part: No; JLCPCB Part Number: C382717; Supplier 1: LCSC; Category: Capacitors - MLCC; Supplier Part Number 1: C382717; Voltage Rating: 50V; Temperature Coefficient: NP0; RoHS: Yes; ComponentLink1Description: Datasheet; ComponentLink1URL: https://wmsc.lcsc.com/wmsc/upload/file/pdf/v2/lcsc/2304140030_Darfon-Elec-C1005NPO100DGT_C382717.pdf; ComponentLink2Description: JLCPCB Part URL; ComponentLink2URL: https://jlcpcb.com/partdetail/C382717; ComponentLink3Description: LCSC Part URL; ComponentLink3URL: https://lcsc.com/product-detail/Multilayer-Ceramic-Capacitors-MLCC---SMD-SMT_Darfon-Elec-Darfon-Elec-C1005NPO100DGT_C382717.html
footprint CAP-0402 (0402 (1005M) Capacitor)
pins: 1, 2

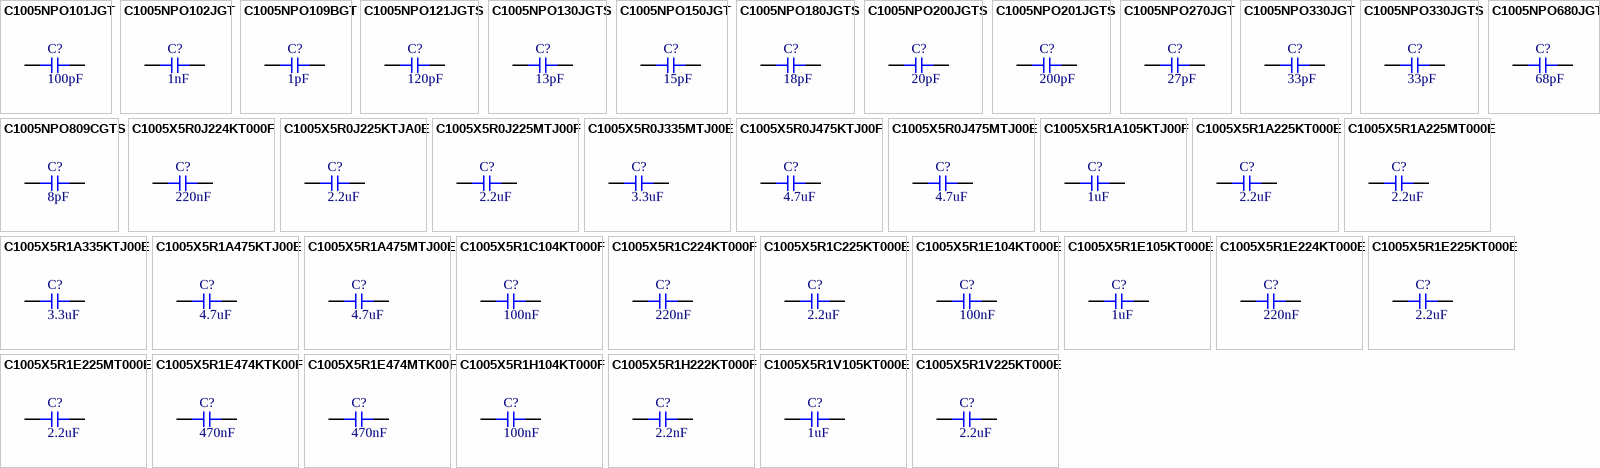
[diagram p26: symbols C1005NPO101JGT to C1005X5R1V225KT000E]

## C1005NPO101JGT
designator C?  Capacitance: 100pF  (hidden comment: *)
Capacitor, Ceramic (MLCC), 100pF, ±5%, 50V, NP0, ±5%, SMD 0402; Manufacturer: Darfon Elec; Manufacturer Part Number: C1005NPO101JGT; Package Size: 0402; JLCPCB Basic Part: No; JLCPCB Part Number: C382718; Supplier 1: LCSC; Category: Capacitors - MLCC; Supplier Part Number 1: C382718; Tolerance: ±5%; Voltage Rating: 50V; Temperature Coefficient: NP0; RoHS: Yes; ComponentLink1Description: Datasheet; ComponentLink1URL: https://wmsc.lcsc.com/wmsc/upload/file/pdf/v2/lcsc/2304140030_Darfon-Elec-C1005NPO101JGT_C382718.pdf; ComponentLink2Description: JLCPCB Part URL; ComponentLink2URL: https://jlcpcb.com/partdetail/C382718; ComponentLink3Description: LCSC Part URL; ComponentLink3URL: https://lcsc.com/product-detail/Multilayer-Ceramic-Capacitors-MLCC---SMD-SMT_Darfon-Elec-Darfon-Elec-C1005NPO101JGT_C382718.html
footprint CAP-0402 (0402 (1005M) Capacitor)
pins: 1, 2

## C1005NPO102JGT
designator C?  Capacitance: 1nF  (hidden comment: *)
Capacitor, Ceramic (MLCC), 1nF, ±5%, 50V, NP0, ±5%, SMD 0402; Manufacturer: Darfon Elec; Manufacturer Part Number: C1005NPO102JGT; Package Size: 0402; JLCPCB Basic Part: No; JLCPCB Part Number: C424332; Supplier 1: LCSC; Category: Capacitors - MLCC; Supplier Part Number 1: C424332; Tolerance: ±5%; Voltage Rating: 50V; Temperature Coefficient: NP0; RoHS: Yes; ComponentLink1Description: Datasheet; ComponentLink1URL: https://wmsc.lcsc.com/wmsc/upload/file/pdf/v2/lcsc/2304140030_Darfon-Elec-C1005NPO102JGT_C424332.pdf; ComponentLink2Description: JLCPCB Part URL; ComponentLink2URL: https://jlcpcb.com/partdetail/C424332; ComponentLink3Description: LCSC Part URL; ComponentLink3URL: https://lcsc.com/product-detail/Multilayer-Ceramic-Capacitors-MLCC---SMD-SMT_Darfon-Elec-Darfon-Elec-C1005NPO102JGT_C424332.html
footprint CAP-0402 (0402 (1005M) Capacitor)
pins: 1, 2

## C1005NPO109BGT
designator C?  Capacitance: 1pF  (hidden comment: *)
Capacitor, Ceramic (MLCC), 1pF, 50V, NP0, SMD 0402; Manufacturer: Darfon Elec; Manufacturer Part Number: C1005NPO109BGT; Package Size: 0402; JLCPCB Basic Part: No; JLCPCB Part Number: C359296; Supplier 1: LCSC; Category: Capacitors - MLCC; Supplier Part Number 1: C359296; Voltage Rating: 50V; Temperature Coefficient: NP0; RoHS: Yes; ComponentLink1Description: Datasheet; ComponentLink1URL: https://wmsc.lcsc.com/wmsc/upload/file/pdf/v2/lcsc/2304140030_Darfon-Elec-C1005NPO109BGT_C359296.pdf; ComponentLink2Description: JLCPCB Part URL; ComponentLink2URL: https://jlcpcb.com/partdetail/C359296; ComponentLink3Description: LCSC Part URL; ComponentLink3URL: https://lcsc.com/product-detail/Multilayer-Ceramic-Capacitors-MLCC---SMD-SMT_Darfon-Elec-Darfon-Elec-C1005NPO109BGT_C359296.html
footprint CAP-0402 (0402 (1005M) Capacitor)
pins: 1, 2

## C1005NPO121JGTS
designator C?  Capacitance: 120pF  (hidden comment: *)
Capacitor, Ceramic (MLCC), 120pF, ±5%, 50V, NP0, ±5%, SMD 0402; Manufacturer: Darfon Elec; Manufacturer Part Number: C1005NPO121JGTS; Package Size: 0402; JLCPCB Basic Part: No; JLCPCB Part Number: C513746; Supplier 1: LCSC; Category: Capacitors - MLCC; Supplier Part Number 1: C513746; Tolerance: ±5%; Voltage Rating: 50V; Temperature Coefficient: NP0; RoHS: Yes; ComponentLink1Description: Datasheet; ComponentLink1URL: https://wmsc.lcsc.com/wmsc/upload/file/pdf/v2/lcsc/2304140030_Darfon-Elec-C1005NPO121JGTS_C513746.pdf; ComponentLink2Description: JLCPCB Part URL; ComponentLink2URL: https://jlcpcb.com/partdetail/C513746; ComponentLink3Description: LCSC Part URL; ComponentLink3URL: https://lcsc.com/product-detail/Multilayer-Ceramic-Capacitors-MLCC---SMD-SMT_Darfon-Elec-Darfon-Elec-C1005NPO121JGTS_C513746.html
footprint CAP-0402 (0402 (1005M) Capacitor)
pins: 1, 2

## C1005NPO130JGTS
designator C?  Capacitance: 13pF  (hidden comment: *)
Capacitor, Ceramic (MLCC), 13pF, ±5%, 50V, NP0, ±5%, SMD 0402; Manufacturer: Darfon Elec; Manufacturer Part Number: C1005NPO130JGTS; Package Size: 0402; JLCPCB Basic Part: No; JLCPCB Part Number: C513745; Supplier 1: LCSC; Category: Capacitors - MLCC; Supplier Part Number 1: C513745; Tolerance: ±5%; Voltage Rating: 50V; Temperature Coefficient: NP0; RoHS: Yes; ComponentLink1Description: Datasheet; ComponentLink1URL: https://wmsc.lcsc.com/wmsc/upload/file/pdf/v2/lcsc/2304140030_Darfon-Elec-C1005NPO130JGTS_C513745.pdf; ComponentLink2Description: JLCPCB Part URL; ComponentLink2URL: https://jlcpcb.com/partdetail/C513745; ComponentLink3Description: LCSC Part URL; ComponentLink3URL: https://lcsc.com/product-detail/Multilayer-Ceramic-Capacitors-MLCC---SMD-SMT_Darfon-Elec-Darfon-Elec-C1005NPO130JGTS_C513745.html
footprint CAP-0402 (0402 (1005M) Capacitor)
pins: 1, 2

## C1005NPO150JGT
designator C?  Capacitance: 15pF  (hidden comment: *)
Capacitor, Ceramic (MLCC), 15pF, ±5%, 50V, NP0, ±5%, SMD 0402; Manufacturer: Darfon Elec; Manufacturer Part Number: C1005NPO150JGT; Package Size: 0402; JLCPCB Basic Part: No; JLCPCB Part Number: C382720; Supplier 1: LCSC; Category: Capacitors - MLCC; Supplier Part Number 1: C382720; Tolerance: ±5%; Voltage Rating: 50V; Temperature Coefficient: NP0; RoHS: Yes; ComponentLink1Description: Datasheet; ComponentLink1URL: https://wmsc.lcsc.com/wmsc/upload/file/pdf/v2/lcsc/2304140030_Darfon-Elec-C1005NPO150JGT_C382720.pdf; ComponentLink2Description: JLCPCB Part URL; ComponentLink2URL: https://jlcpcb.com/partdetail/C382720; ComponentLink3Description: LCSC Part URL; ComponentLink3URL: https://lcsc.com/product-detail/Multilayer-Ceramic-Capacitors-MLCC---SMD-SMT_Darfon-Elec-Darfon-Elec-C1005NPO150JGT_C382720.html
footprint CAP-0402 (0402 (1005M) Capacitor)
pins: 1, 2

## C1005NPO180JGTS
designator C?  Capacitance: 18pF  (hidden comment: *)
Capacitor, Ceramic (MLCC), 18pF, ±5%, 50V, NP0, ±5%, SMD 0402; Manufacturer: Darfon Elec; Manufacturer Part Number: C1005NPO180JGTS; Package Size: 0402; JLCPCB Basic Part: No; JLCPCB Part Number: C424334; Supplier 1: LCSC; Category: Capacitors - MLCC; Supplier Part Number 1: C424334; Tolerance: ±5%; Voltage Rating: 50V; Temperature Coefficient: NP0; RoHS: Yes; ComponentLink1Description: Datasheet; ComponentLink1URL: https://wmsc.lcsc.com/wmsc/upload/file/pdf/v2/lcsc/2304140030_Darfon-Elec-C1005NPO180JGTS_C424334.pdf; ComponentLink2Description: JLCPCB Part URL; ComponentLink2URL: https://jlcpcb.com/partdetail/C424334; ComponentLink3Description: LCSC Part URL; ComponentLink3URL: https://lcsc.com/product-detail/Multilayer-Ceramic-Capacitors-MLCC---SMD-SMT_Darfon-Elec-Darfon-Elec-C1005NPO180JGTS_C424334.html
footprint CAP-0402 (0402 (1005M) Capacitor)
pins: 1, 2

## C1005NPO200JGTS
designator C?  Capacitance: 20pF  (hidden comment: *)
Capacitor, Ceramic (MLCC), 20pF, ±5%, 50V, NP0, ±5%, SMD 0402; Manufacturer: Darfon Elec; Manufacturer Part Number: C1005NPO200JGTS; Package Size: 0402; JLCPCB Basic Part: No; JLCPCB Part Number: C513751; Supplier 1: LCSC; Category: Capacitors - MLCC; Supplier Part Number 1: C513751; Tolerance: ±5%; Voltage Rating: 50V; Temperature Coefficient: NP0; RoHS: Yes; ComponentLink1Description: Datasheet; ComponentLink1URL: https://wmsc.lcsc.com/wmsc/upload/file/pdf/v2/lcsc/2304140030_Darfon-Elec-C1005NPO200JGTS_C513751.pdf; ComponentLink2Description: JLCPCB Part URL; ComponentLink2URL: https://jlcpcb.com/partdetail/C513751; ComponentLink3Description: LCSC Part URL; ComponentLink3URL: https://lcsc.com/product-detail/Multilayer-Ceramic-Capacitors-MLCC---SMD-SMT_Darfon-Elec-Darfon-Elec-C1005NPO200JGTS_C513751.html
footprint CAP-0402 (0402 (1005M) Capacitor)
pins: 1, 2

## C1005NPO201JGTS
designator C?  Capacitance: 200pF  (hidden comment: *)
Capacitor, Ceramic (MLCC), 200pF, ±5%, 50V, NP0, ±5%, SMD 0402; Manufacturer: Darfon Elec; Manufacturer Part Number: C1005NPO201JGTS; Package Size: 0402; JLCPCB Basic Part: No; JLCPCB Part Number: C513740; Supplier 1: LCSC; Category: Capacitors - MLCC; Supplier Part Number 1: C513740; Tolerance: ±5%; Voltage Rating: 50V; Temperature Coefficient: NP0; RoHS: Yes; ComponentLink1Description: Datasheet; ComponentLink1URL: https://wmsc.lcsc.com/wmsc/upload/file/pdf/v2/lcsc/2304140030_Darfon-Elec-C1005NPO201JGTS_C513740.pdf; ComponentLink2Description: JLCPCB Part URL; ComponentLink2URL: https://jlcpcb.com/partdetail/C513740; ComponentLink3Description: LCSC Part URL; ComponentLink3URL: https://lcsc.com/product-detail/Multilayer-Ceramic-Capacitors-MLCC---SMD-SMT_Darfon-Elec-Darfon-Elec-C1005NPO201JGTS_C513740.html
footprint CAP-0402 (0402 (1005M) Capacitor)
pins: 1, 2

## C1005NPO270JGT
designator C?  Capacitance: 27pF  (hidden comment: *)
Capacitor, Ceramic (MLCC), 27pF, ±5%, 50V, NP0, ±5%, SMD 0402; Manufacturer: Darfon Elec; Manufacturer Part Number: C1005NPO270JGT; Package Size: 0402; JLCPCB Basic Part: No; JLCPCB Part Number: C382723; Supplier 1: LCSC; Category: Capacitors - MLCC; Supplier Part Number 1: C382723; Tolerance: ±5%; Voltage Rating: 50V; Temperature Coefficient: NP0; RoHS: Yes; ComponentLink1Description: Datasheet; ComponentLink1URL: https://wmsc.lcsc.com/wmsc/upload/file/pdf/v2/lcsc/2304140030_Darfon-Elec-C1005NPO270JGT_C382723.pdf; ComponentLink2Description: JLCPCB Part URL; ComponentLink2URL: https://jlcpcb.com/partdetail/C382723; ComponentLink3Description: LCSC Part URL; ComponentLink3URL: https://lcsc.com/product-detail/Multilayer-Ceramic-Capacitors-MLCC---SMD-SMT_Darfon-Elec-Darfon-Elec-C1005NPO270JGT_C382723.html
footprint CAP-0402 (0402 (1005M) Capacitor)
pins: 1, 2

## C1005NPO330JGT
designator C?  Capacitance: 33pF  (hidden comment: *)
Capacitor, Ceramic (MLCC), 33pF, ±5%, 50V, NP0, ±5%, SMD 0402; Manufacturer: Darfon Elec; Manufacturer Part Number: C1005NPO330JGT; Package Size: 0402; JLCPCB Basic Part: No; JLCPCB Part Number: C382724; Supplier 1: LCSC; Category: Capacitors - MLCC; Supplier Part Number 1: C382724; Tolerance: ±5%; Voltage Rating: 50V; Temperature Coefficient: NP0; RoHS: Yes; ComponentLink1Description: Datasheet; ComponentLink1URL: https://wmsc.lcsc.com/wmsc/upload/file/pdf/v2/lcsc/2304140030_Darfon-Elec-C1005NPO330JGT_C382724.pdf; ComponentLink2Description: JLCPCB Part URL; ComponentLink2URL: https://jlcpcb.com/partdetail/C382724; ComponentLink3Description: LCSC Part URL; ComponentLink3URL: https://lcsc.com/product-detail/Multilayer-Ceramic-Capacitors-MLCC---SMD-SMT_Darfon-Elec-Darfon-Elec-C1005NPO330JGT_C382724.html
footprint CAP-0402 (0402 (1005M) Capacitor)
pins: 1, 2

## C1005NPO330JGTS
designator C?  Capacitance: 33pF  (hidden comment: *)
Capacitor, Ceramic (MLCC), 33pF, ±5%, 50V, NP0, ±5%, SMD 0402; Manufacturer: Darfon Elec; Manufacturer Part Number: C1005NPO330JGTS; Package Size: 0402; JLCPCB Basic Part: No; JLCPCB Part Number: C513741; Supplier 1: LCSC; Category: Capacitors - MLCC; Supplier Part Number 1: C513741; Tolerance: ±5%; Voltage Rating: 50V; Temperature Coefficient: NP0; RoHS: Yes; ComponentLink1Description: Datasheet; ComponentLink1URL: https://wmsc.lcsc.com/wmsc/upload/file/pdf/v2/lcsc/2304140030_Darfon-Elec-C1005NPO330JGTS_C513741.pdf; ComponentLink2Description: JLCPCB Part URL; ComponentLink2URL: https://jlcpcb.com/partdetail/C513741; ComponentLink3Description: LCSC Part URL; ComponentLink3URL: https://lcsc.com/product-detail/Multilayer-Ceramic-Capacitors-MLCC---SMD-SMT_Darfon-Elec-Darfon-Elec-C1005NPO330JGTS_C513741.html
footprint CAP-0402 (0402 (1005M) Capacitor)
pins: 1, 2

## C1005NPO680JGT
designator C?  Capacitance: 68pF  (hidden comment: *)
Capacitor, Ceramic (MLCC), 68pF, ±5%, 50V, NP0, ±5%, SMD 0402; Manufacturer: Darfon Elec; Manufacturer Part Number: C1005NPO680JGT; Package Size: 0402; JLCPCB Basic Part: No; JLCPCB Part Number: C382728; Supplier 1: LCSC; Category: Capacitors - MLCC; Supplier Part Number 1: C382728; Tolerance: ±5%; Voltage Rating: 50V; Temperature Coefficient: NP0; RoHS: Yes; ComponentLink1Description: Datasheet; ComponentLink1URL: https://wmsc.lcsc.com/wmsc/upload/file/pdf/v2/lcsc/2304140030_Darfon-Elec-C1005NPO680JGT_C382728.pdf; ComponentLink2Description: JLCPCB Part URL; ComponentLink2URL: https://jlcpcb.com/partdetail/C382728; ComponentLink3Description: LCSC Part URL; ComponentLink3URL: https://lcsc.com/product-detail/Multilayer-Ceramic-Capacitors-MLCC---SMD-SMT_Darfon-Elec-Darfon-Elec-C1005NPO680JGT_C382728.html
footprint CAP-0402 (0402 (1005M) Capacitor)
pins: 1, 2

## C1005NPO809CGTS
designator C?  Capacitance: 8pF  (hidden comment: *)
Capacitor, Ceramic (MLCC), 8pF, 50V, NP0, SMD 0402; Manufacturer: Darfon Elec; Manufacturer Part Number: C1005NPO809CGTS; Package Size: 0402; JLCPCB Basic Part: No; JLCPCB Part Number: C513748; Supplier 1: LCSC; Category: Capacitors - MLCC; Supplier Part Number 1: C513748; Voltage Rating: 50V; Temperature Coefficient: NP0; RoHS: Yes; ComponentLink1Description: Datasheet; ComponentLink1URL: https://wmsc.lcsc.com/wmsc/upload/file/pdf/v2/lcsc/2304140030_Darfon-Elec-C1005NPO809CGTS_C513748.pdf; ComponentLink2Description: JLCPCB Part URL; ComponentLink2URL: https://jlcpcb.com/partdetail/C513748; ComponentLink3Description: LCSC Part URL; ComponentLink3URL: https://lcsc.com/product-detail/Multilayer-Ceramic-Capacitors-MLCC---SMD-SMT_Darfon-Elec-Darfon-Elec-C1005NPO809CGTS_C513748.html
footprint CAP-0402 (0402 (1005M) Capacitor)
pins: 1, 2

## C1005X5R0J224KT000F
designator C?  Capacitance: 220nF  (hidden comment: *)
Capacitor, Ceramic (MLCC), 220nF, ±10%, 6.3V, X5R, ±10%, SMD 0402; Manufacturer: TDK; Manufacturer Part Number: C1005X5R0J224KT000F; Package Size: 0402; JLCPCB Basic Part: No; JLCPCB Part Number: C76593; Supplier 1: LCSC; Category: Capacitors - MLCC; Supplier Part Number 1: C76593; Tolerance: ±10%; Voltage Rating: 6.3V; Temperature Coefficient: X5R; RoHS: Yes; ComponentLink1Description: Datasheet; ComponentLink1URL: https://wmsc.lcsc.com/wmsc/upload/file/pdf/v2/lcsc/2304140030_TDK-C1005X5R0J224KT000F_C76593.pdf; ComponentLink2Description: JLCPCB Part URL; ComponentLink2URL: https://jlcpcb.com/partdetail/C76593; ComponentLink3Description: LCSC Part URL; ComponentLink3URL: https://lcsc.com/product-detail/Multilayer-Ceramic-Capacitors-MLCC---SMD-SMT_TDK-TDK-C1005X5R0J224KT000F_C76593.html
footprint CAP-0402 (0402 (1005M) Capacitor)
pins: 1, 2

## C1005X5R0J225KTJA0E
designator C?  Capacitance: 2.2uF  (hidden comment: *)
Capacitor, Ceramic (MLCC), 2.2uF, ±10%, 6.3V, X5R, ±10%, SMD 0402; Manufacturer: TDK; Manufacturer Part Number: C1005X5R0J225KTJA0E; Package Size: 0402; JLCPCB Basic Part: No; JLCPCB Part Number: C343036; Supplier 1: LCSC; Category: Capacitors - MLCC; Supplier Part Number 1: C343036; Tolerance: ±10%; Voltage Rating: 6.3V; Temperature Coefficient: X5R; RoHS: Yes; ComponentLink1Description: Datasheet; ComponentLink1URL: https://wmsc.lcsc.com/wmsc/upload/file/pdf/v2/lcsc/2304140030_TDK-C1005X5R0J225KTJA0E_C343036.pdf; ComponentLink2Description: JLCPCB Part URL; ComponentLink2URL: https://jlcpcb.com/partdetail/C343036; ComponentLink3Description: LCSC Part URL; ComponentLink3URL: https://lcsc.com/product-detail/Multilayer-Ceramic-Capacitors-MLCC---SMD-SMT_TDK-TDK-C1005X5R0J225KTJA0E_C343036.html
footprint CAP-0402 (0402 (1005M) Capacitor)
pins: 1, 2
